# Altium footprint library SparkFun-Retired.PCBLIB: 302 footprints (part 15 of 19)
Each footprint in its own frame and in the unit in brackets; x right, y up, seen from the top. Pads: shape width x height; smd on the part's side, far side on the other; paste and mask are expansions set on the pad; w line width, h text height; cw(c..) or ccw(c..) is an arc to the next point about the centre after c.
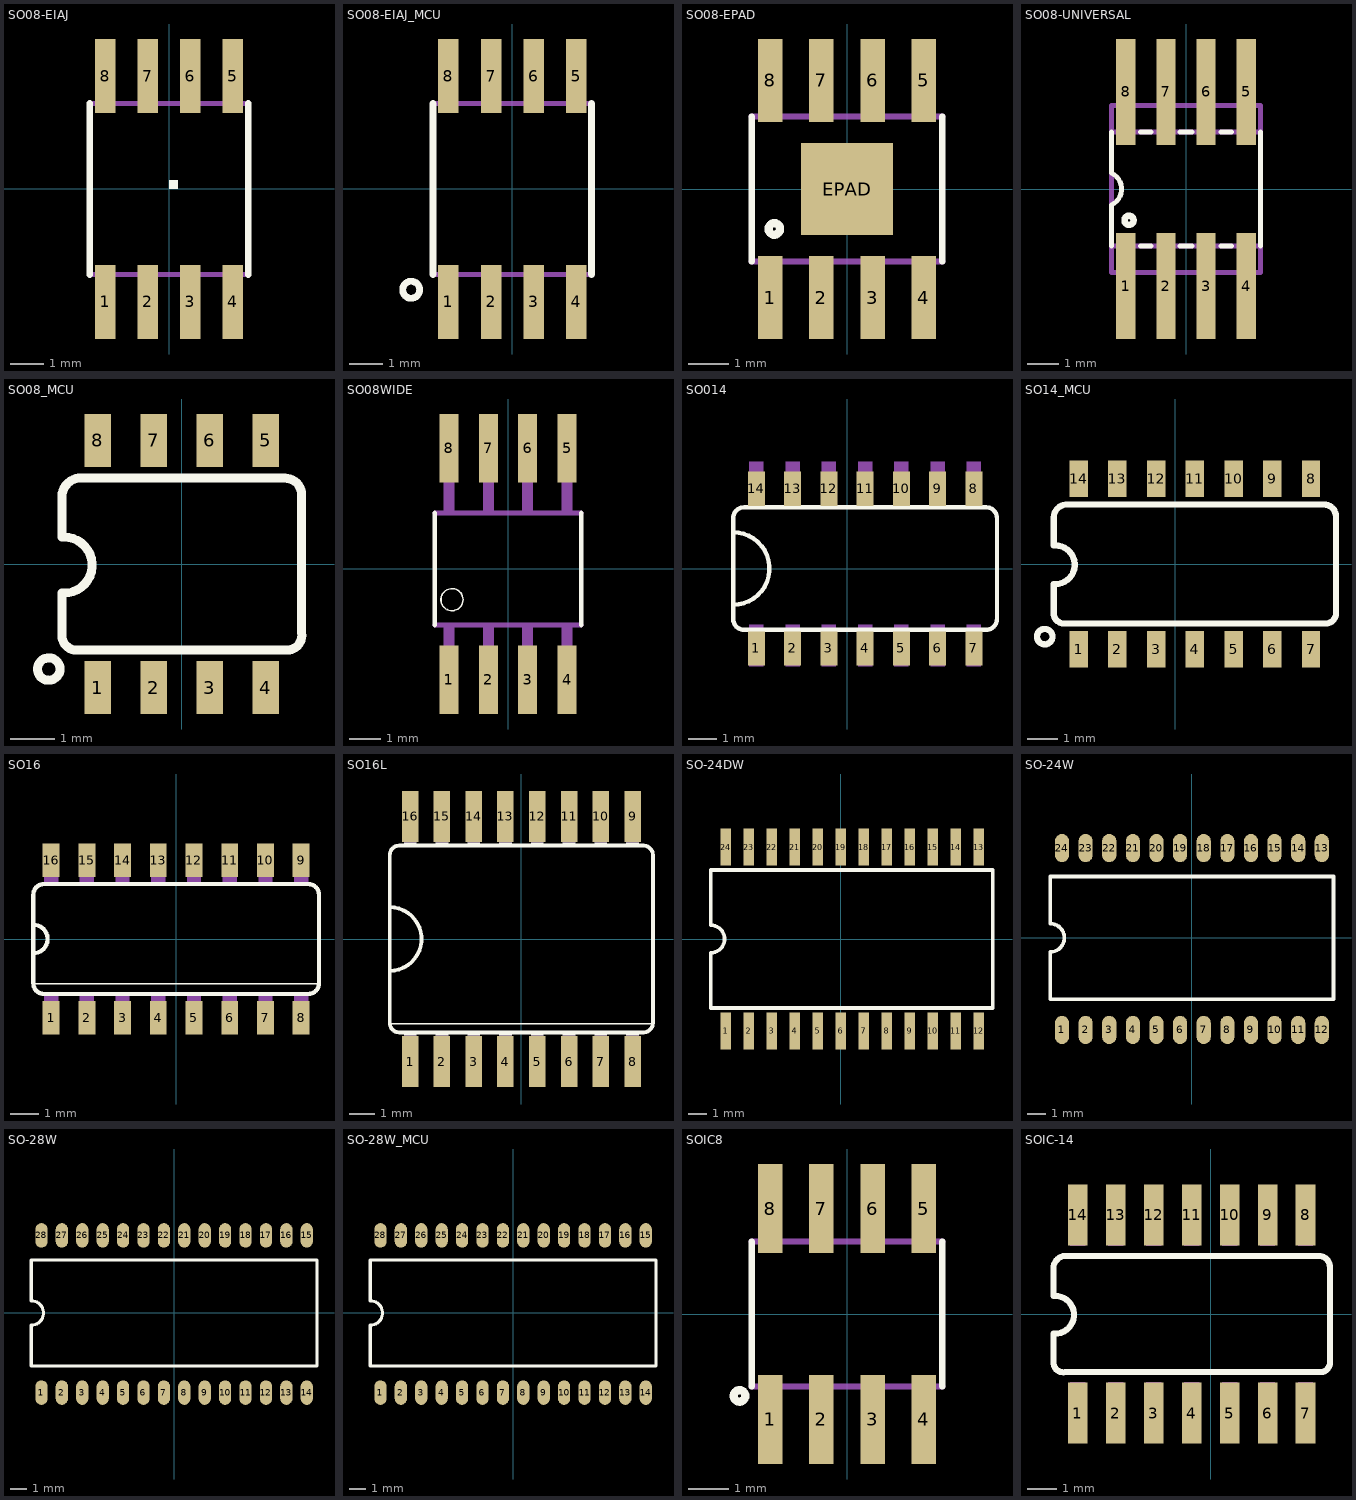
[diagram p14: the footprints below, top view; thin cyan lines are the x and y axes]

## SO08-EIAJ [mil]
pads (8):
  rect 24x87 smd: 1(-75,-133) 2(-25,-133) 3(25,-133) 4(75,-133) 5(75,132) 6(25,132) 7(-25,132) 8(-75,132)
Top Overlay:
  region: 0,0 10,0 10,10 0,10
  lines w8: -92.99,-100.98 -92.99,99.98 ; 92.99,-100.98 92.99,99.98
Mechanical 16:
  rectangle: -82,-143 -68,-103
  rectangle: -32,-143 -18,-103
  rectangle: 18,-143 32,-103
  rectangle: 68,-143 82,-103
  rectangle: -82,102 -68,142
  rectangle: -32,102 -18,142
  rectangle: 18,102 32,142
  rectangle: 68,102 82,142
  lines w6: -92.99,-100.98 92.99,-100.98 ; -92.99,99.98 92.99,99.98

## SO08-EIAJ_MCU [mil]
pads (8):
  rect 24x87 smd: 1(-75,-133) 2(-25,-133) 3(25,-133) 4(75,-133) 5(75,132) 6(25,132) 7(-25,132) 8(-75,132)
Top Overlay:
  circle w8: c-118.75,-118.75 r10
  lines w8: -92.99,-100.98 -92.99,99.98 ; 92.99,-100.98 92.99,99.98
Mechanical 16:
  rectangle: -82,-143 -68,-103
  rectangle: -32,-143 -18,-103
  rectangle: 18,-143 32,-103
  rectangle: 68,-143 82,-103
  rectangle: -82,102 -68,142
  rectangle: -32,102 -18,142
  rectangle: 18,102 32,142
  rectangle: 68,102 82,142
  lines w6: -92.99,-100.98 92.99,-100.98 ; -92.99,99.98 92.99,99.98

## SO08-EPAD [mil]
pads (9):
  rect 24x81 smd: 1(-75,-106) 2(-25,-106) 3(25,-106) 4(75,-106) 5(75,106) 6(25,106) 7(-25,106) 8(-75,106)
  rect 90x90 smd: EPAD(0,0)
Top Overlay:
  circle w8: c-71,-39 r5.65
  lines w6: -92.99,-70.98 -92.99,70.98 ; 92.99,-70.98 92.99,70.98
Mechanical 16:
  rectangle: -82,-113 -68,-73
  rectangle: -32,-113 -18,-73
  rectangle: 18,-113 32,-73
  rectangle: 68,-113 82,-73
  rectangle: -82,73 -68,113
  rectangle: -32,73 -18,113
  rectangle: 18,73 32,113
  rectangle: 68,73 82,113
  lines w6: -92.99,-70.98 92.99,-70.98 ; -92.99,70.98 92.99,70.98

## SO08-UNIVERSAL [mil]
pads (8):
  rect 24x132 smd: 1(-75,-121) 2(-25,-121) 3(25,-121) 4(75,-121) 5(75,121) 6(25,121) 7(-25,121) 8(-75,121)
Top Overlay:
  circle w8: c-71,-39 r5.65
  lines w6: -92.99,-70.98 -92.99,-19.57 ; -92.99,19.57 -92.99,70.98 ; -92.52,-19.69 ccw(c-102.36,0) -92.52,19.69 ; -57.09,-70.87 -43.31,-70.87 ; -57.09,70.87 -43.31,70.87 ; -7.87,-70.87 7.87,-70.87 ; -7.87,70.87 7.87,70.87 ; 43.31,-70.87 57.09,-70.87 ; 43.31,70.87 57.09,70.87 ; 92.99,-70.98 92.99,70.98
Mechanical 16:
  rectangle: -82,-157 -68,-73
  rectangle: -32,-157 -18,-73
  rectangle: 18,-157 32,-73
  rectangle: 68,-157 82,-73
  rectangle: -82,73 -68,157
  rectangle: -32,73 -18,157
  rectangle: 18,73 32,157
  rectangle: 68,73 82,157
  lines w6: -92.99,70.98 92.99,70.98 ; -92.99,-70.98 92.99,-70.98 ; -92.99,-70.98 -92.99,104 92.99,104 92.99,-70.98 ; -92.99,-70.98 -92.99,-104 92.99,-104 92.99,-70.98

## SO08_MCU [mil]
pads (8):
  rect 23.62x47.24 smd: 1(-75,-110.24) 2(-25,-110.24) 3(25,-110.24) 4(75,-110.24) 5(75,110.24) 6(25,110.24) 7(-25,110.24) 8(-75,110.24)
Top Overlay:
  circle w8: c-118.75,-93.75 r10
  lines w8: -107,-26 -107,-65.56 ccw(c-93.97,-63.6) -92,-76.63 95.94,-76.63 ccw(c93.97,-63.6) 107,-61.63 107,61.63 ccw(c92,61.63) 92,76.63 -92,76.63 ccw(c-90.03,59.66) -107,57.69 ; -107,24 -107,57.19 ; -105,-26 ccw(c-105,-1) -105,24
Mechanical 16:
  rectangle: -85,-130 -65,-89.5
  rectangle: -35,-130 -15,-89.5
  rectangle: 15,-130 35,-89.5
  rectangle: 65,-130 85,-89.5
  rectangle: -35,90 -15,130
  rectangle: 15,90 35,130
  rectangle: 65,90 85,130
  rectangle: -85,90 -65,130

## SO08WIDE [mil]
pads (8):
  rect 24x87 smd: 1(-75,-140.5) 2(-25,-140.5) 3(25,-140.5) 4(75,-140.5) 5(75,153) 6(25,153) 7(-25,153) 8(-75,153)
Top Overlay:
  circle w2: c-71,-39 r14
  lines w6: -92.99,-70.98 -92.99,70.98 ; 92.99,-70.98 92.99,70.98
Mechanical 16:
  rectangle: -82,-113 -68,-73
  rectangle: -32,-113 -18,-73
  rectangle: 18,-113 32,-73
  rectangle: 68,-113 82,-73
  rectangle: -82,73 -68,113
  rectangle: -32,73 -18,113
  rectangle: 18,73 32,113
  rectangle: 68,73 82,113
  lines w6: -92.99,-70.98 92.99,-70.98 ; -92.99,70.98 92.99,70.98

## SO014 [mil]
pads (14):
  rect 23.62x47.24 smd: 1(-125,-110.24) 2(-75,-110.24) 3(-25,-110.24) 4(25,-110.24) 5(75,-110.24) 6(125,-110.24) 7(175,-110.24) 8(175,110.24) 9(125,110.24) 10(75,110.24) 11(25,110.24) 12(-25,110.24) 13(-75,110.24) 14(-125,110.24)
Top Overlay:
  rectangle: -135,-89.5 -115,-84.5
  rectangle: -135,-89.5 -115,-84.5
  rectangle: -85,-89.5 -65,-84.5
  rectangle: -35,-89.5 -15,-84.5
  rectangle: 15,-89.5 35,-84.5
  rectangle: 65,-89.5 85,-84.5
  rectangle: 115,-89.5 135,-84.5
  rectangle: 165,-89.5 185,-84.5
  rectangle: -135,84.5 -115,89.5
  rectangle: -135,84.5 -115,89.5
  rectangle: -85,84.5 -65,89.5
  rectangle: -35,84.5 -15,89.5
  rectangle: 15,84.5 35,89.5
  rectangle: 65,84.5 85,89.5
  rectangle: 115,84.5 135,89.5
  rectangle: 165,84.5 185,89.5
  lines w6: -157,-50 -157,50 ; -157,-50 -157,-69.5 ccw(c-142,-69.5) -142,-84.5 192,-84.5 ccw(c192,-69.5) 207,-69.5 207,69.5 ccw(c192,69.5) 192,84.5 -142,84.5 ccw(c-142,69.5) -157,69.5 -157,50 ; -157,-50 ccw(c-157,0) -157,50
Mechanical 16:
  rectangle: -135,-135 -115,-77
  rectangle: -85,-135 -65,-77
  rectangle: -35,-135 -15,-77
  rectangle: 15,-135 35,-77
  rectangle: 65,-135 85,-77
  rectangle: 115,-135 135,-77
  rectangle: 165,-135 185,-77
  rectangle: -135,89.5 -115,147.5
  rectangle: -85,89.5 -65,147.5
  rectangle: -35,89.5 -15,147.5
  rectangle: 15,89.5 35,147.5
  rectangle: 65,89.5 85,147.5
  rectangle: 115,89.5 135,147.5
  rectangle: 165,89.5 185,147.5

## SO14_MCU [mil]
pads (14):
  rect 23.62x47.24 smd: 1(-125,-110.24) 2(-75,-110.24) 3(-25,-110.24) 4(25,-110.24) 5(75,-110.24) 6(125,-110.24) 7(175,-110.24) 8(175,110.24) 9(125,110.24) 10(75,110.24) 11(25,110.24) 12(-25,110.24) 13(-75,110.24) 14(-125,110.24)
Top Overlay:
  circle w8: c-168.75,-93.75 r10
  lines w8: -157,-26 -157,-65.56 ccw(c-143.97,-63.6) -142,-76.63 195.94,-76.63 ccw(c193.97,-63.6) 207,-61.63 207,61.63 ccw(c192,61.63) 192,76.63 -142,76.63 ccw(c-140.03,59.66) -157,57.69 ; -157,24 -157,57.19 ; -155,-26 ccw(c-155,-1) -155,24
Mechanical 16:
  rectangle: -135,-130 -115,-89.5
  rectangle: -85,-130 -65,-89.5
  rectangle: -35,-130 -15,-89.5
  rectangle: 15,-130 35,-89.5
  rectangle: 65,-130 85,-89.5
  rectangle: 115,-130 135,-89.5
  rectangle: 165,-130 185,-89.5
  rectangle: -85,90 -65,130
  rectangle: -35,90 -15,130
  rectangle: 15,90 35,130
  rectangle: 65,90 85,130
  rectangle: 115,90 135,130
  rectangle: 165,90 185,130
  rectangle: -135,90 -115,130

## SO16 [mil]
pads (16):
  rect 23.62x47.24 smd: 1(-175,-110.24) 2(-125,-110.24) 3(-75,-110.24) 4(-25,-110.24) 5(25,-110.24) 6(75,-110.24) 7(125,-110.24) 8(175,-110.24) 9(175,110.24) 10(125,110.24) 11(75,110.24) 12(25,110.24) 13(-25,110.24) 14(-75,110.24) 15(-125,110.24) 16(-175,110.24)
Top Overlay:
  lines w2: -200,-63 200,-63
  lines w6: -200,-20 -200,20 ; -200,-20 -200,-62 ccw(c-185,-62) -185,-77 185,-77 ccw(c185,-62) 200,-62 200,62 ccw(c185,62) 185,77 -185,77 ccw(c-185,62) -200,62 -200,20 ; -200,-20 ccw(c-200,0) -200,20
Mechanical 16:
  rectangle: -35,77 -15,122
  rectangle: -185,-122 -165,-77
  rectangle: -135,-122 -115,-77
  rectangle: -85,-121 -65,-76
  rectangle: -35,-122 -15,-77
  rectangle: -85,77 -65,122
  rectangle: -135,77 -115,122
  rectangle: -185,77 -165,122
  rectangle: 15,-122 35,-77
  rectangle: 65,-122 85,-77
  rectangle: 115,-122 135,-77
  rectangle: 165,-122 185,-77
  rectangle: 15,77 35,122
  rectangle: 65,77 85,122
  rectangle: 115,77 135,122
  rectangle: 165,77 185,122

## SO16L [mil]
pads (16):
  rect 26x80 smd: 1(-175,-193) 2(-125,-193) 3(-75,-193) 4(-25,-193) 5(25,-193) 6(75,-193) 7(125,-193) 8(175,-193) 9(175,193) 10(125,193) 11(75,193) 12(25,193) 13(-25,193) 14(-75,193) 15(-125,193) 16(-175,193)
Top Overlay:
  rectangle: -185,-152 -165,-147
  rectangle: -135,-152 -115,-147
  rectangle: -85,-152 -65,-147
  rectangle: -35,-152 -15,-147
  rectangle: 15,-152 35,-147
  rectangle: 65,-152 85,-147
  rectangle: 115,-152 135,-147
  rectangle: 165,-152 185,-147
  rectangle: -185,147 -165,152
  rectangle: -135,147 -115,152
  rectangle: -85,147 -65,152
  rectangle: -35,147 -15,152
  rectangle: 15,147 35,152
  rectangle: 65,147 85,152
  rectangle: 115,147 135,152
  rectangle: 165,147 185,152
  lines w2: -205,-133 206,-133
  lines w6: -207,-50 ccw(c-207,0) -207,50 ; -207,-132 ccw(c-192,-132) -192,-147 192,-147 ccw(c192,-132) 207,-132 207,132 ccw(c192,132) 192,147 -192,147 ccw(c-192,132) -207,132 -207,-132
Mechanical 16:
  rectangle: -185,-210 -165,-152
  rectangle: -135,-210 -115,-152
  rectangle: -85,-210 -65,-152
  rectangle: -35,-210 -15,-152
  rectangle: 15,-210 35,-152
  rectangle: 65,-210 85,-152
  rectangle: 115,-210 135,-152
  rectangle: 165,-210 185,-152
  rectangle: -185,152 -165,210
  rectangle: -135,152 -115,210
  rectangle: -85,152 -65,210
  rectangle: -35,152 -15,210
  rectangle: 15,152 35,210
  rectangle: 65,152 85,210
  rectangle: 115,152 135,210
  rectangle: 165,152 185,210

## SO-24DW [mil]
pads (24):
  rect 23x80 smd: 1(-250,-200) 2(-200,-200) 3(-150,-200) 4(-100,-200) 5(-50,-200) 6(0,-200) 7(50,-200) 8(100,-200) 9(150,-200) 10(200,-200) 11(250,-200) 12(300,-200) 13(300,200) 14(250,200) 15(200,200) 16(150,200) 17(100,200) 18(50,200) 19(0,200) 20(-50,200) 21(-100,200) 22(-150,200) 23(-200,200) 24(-250,200)
Top Overlay:
  lines w8: -283,-150 331,-150 331,150 -283,150 -283,30 cw(c-283,0) -283,-30 -283,-150

## SO-24W [mil]
pads (24):
  rrect100% 30x60 smd: 1(-275,-195) 2(-225,-195) 3(-175,-195) 4(-125,-195) 5(-75,-195) 6(-25,-195) 7(25,-195) 8(75,-195) 9(125,-195) 10(175,-195) 11(225,-195) 12(275,-195) 13(275,190) 14(225,190) 15(175,190) 16(125,190) 17(75,190) 18(25,190) 19(-25,190) 20(-75,190) 21(-125,190) 22(-175,190) 23(-225,190) 24(-275,190)
Top Overlay:
  lines w8: -300,-130 300,-130 300,130 -300,130 -300,30 cw(c-300,0) -300,-30 -300,-130

## SO-28W [mil]
pads (28):
  rrect100% 30x60 smd: 1(-325,-195) 2(-275,-195) 3(-225,-195) 4(-175,-195) 5(-125,-195) 6(-75,-195) 7(-25,-195) 8(25,-195) 9(75,-195) 10(125,-195) 11(175,-195) 12(225,-195) 13(275,-195) 14(325,-195) 15(325,190) 16(275,190) 17(225,190) 18(175,190) 19(125,190) 20(75,190) 21(25,190) 22(-25,190) 23(-75,190) 24(-125,190) 25(-175,190) 26(-225,190) 27(-275,190) 28(-325,190)
Top Overlay:
  lines w8: -350,-130 350,-130 350,130 -350,130 -350,30 cw(c-350,0) -350,-30 -350,-130

## SO-28W_MCU [mil]
pads (28):
  rrect100% 30x60 smd: 1(-325,-195) 2(-275,-195) 3(-225,-195) 4(-175,-195) 5(-125,-195) 6(-75,-195) 7(-25,-195) 8(25,-195) 9(75,-195) 10(125,-195) 11(175,-195) 12(225,-195) 13(275,-195) 14(325,-195) 15(325,190) 16(275,190) 17(225,190) 18(175,190) 19(125,190) 20(75,190) 21(25,190) 22(-25,190) 23(-75,190) 24(-125,190) 25(-175,190) 26(-225,190) 27(-275,190) 28(-325,190)
Top Overlay:
  lines w8: -350,-130 350,-130 350,130 -350,130 -350,30 cw(c-350,0) -350,-30 -350,-130

## SOIC8 [mil]
pads (8):
  rect 24x87 smd: 1(-75,-103) 2(-25,-103) 3(25,-103) 4(75,-103) 5(75,103) 6(25,103) 7(-25,103) 8(-75,103)
Top Overlay:
  circle w8: c-105,-80 r5.65
  lines w6: -92.99,-70.98 -92.99,70.98 ; 92.99,-70.98 92.99,70.98
Mechanical 16:
  rectangle: -82,-113 -68,-73
  rectangle: -32,-113 -18,-73
  rectangle: 18,-113 32,-73
  rectangle: 68,-113 82,-73
  rectangle: -82,73 -68,113
  rectangle: -32,73 -18,113
  rectangle: 18,73 32,113
  rectangle: 68,73 82,113
  lines w6: -92.99,-70.98 92.99,-70.98 ; -92.99,70.98 92.99,70.98

## SOIC-14 [mil]
pads (14):
  rect 26x80 smd: 1(-175,-130.5) 2(-125,-130.5) 3(-75,-130.5) 4(-25,-130.5) 5(25,-130.5) 6(75,-130.5) 7(125,-130.5) 8(125,130.5) 9(75,130.5) 10(25,130.5) 11(-25,130.5) 12(-75,130.5) 13(-125,130.5) 14(-175,130.5)
Top Overlay:
  lines w8: -207,-26 -207,-65.56 ccw(c-193.97,-63.6) -192,-76.63 145.94,-76.63 ccw(c143.97,-63.6) 157,-61.63 157,61.63 ccw(c142,61.63) 142,76.63 -192,76.63 ccw(c-190.03,59.66) -207,57.69 ; -207,24 -207,57.19 ; -205,-26 ccw(c-205,-1) -205,24
Mechanical 16:
  rectangle: -185,-147.5 -165,-89.5
  rectangle: -135,-147.5 -115,-89.5
  rectangle: -85,-147.5 -65,-89.5
  rectangle: -35,-147.5 -15,-89.5
  rectangle: 15,-147.5 35,-89.5
  rectangle: 65,-147.5 85,-89.5
  rectangle: 115,-147.5 135,-89.5
  rectangle: -185,89.5 -165,147.5
  rectangle: -135,89.5 -115,147.5
  rectangle: -85,89.5 -65,147.5
  rectangle: -35,89.5 -15,147.5
  rectangle: 15,89.5 35,147.5
  rectangle: 65,89.5 85,147.5
  rectangle: 115,89.5 135,147.5